# Altium footprint library Connectors THD.PcbLib: 631 footprints (part 46 of 46)
Each footprint in its own frame and in the unit in brackets; x right, y up, seen from the top. Pads: shape width x height; smd on the part's side, far side on the other; paste and mask are expansions set on the pad; w line width, h text height; cw(c..) or ccw(c..) is an arc to the next point about the centre after c.
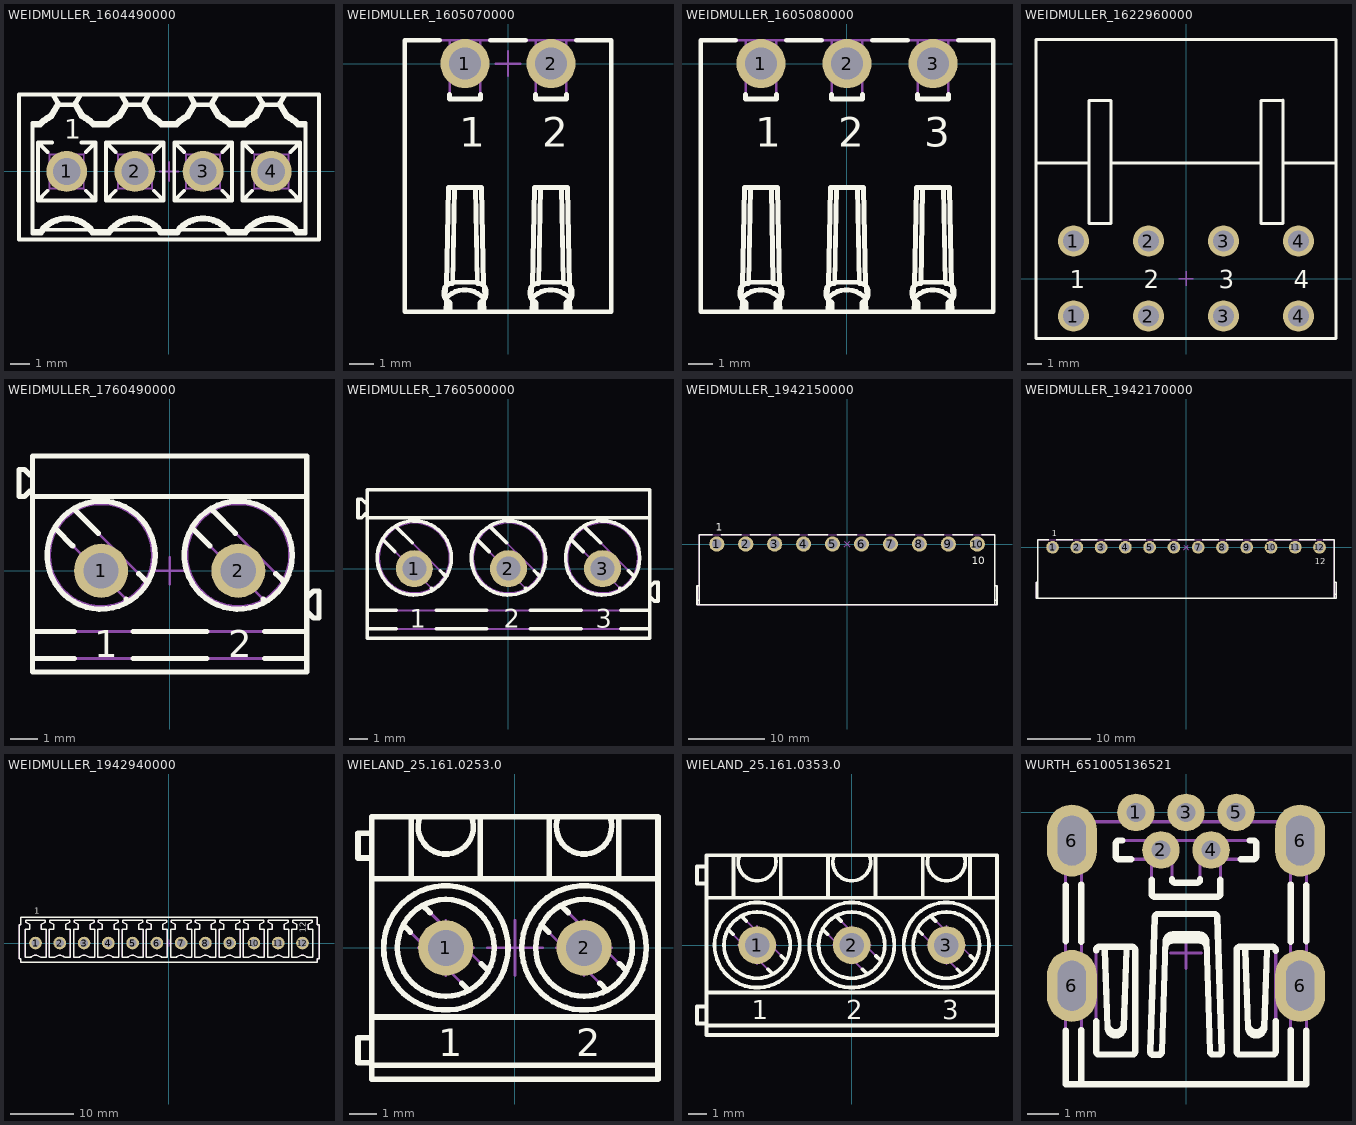
[diagram p45: the footprints below, top view; thin cyan lines are the x and y axes]

## WEIDMULLER_1604490000 [mm] "17A 320 V, Pitch 3.5mm, 4 Positions PCB Male Header, Type SL 3.5 Serie"
height 11.1
pads (4):
  round 2.1 hole 1.4: 1(-5.25,0) 2(-1.75,0) 3(1.75,0) 4(5.25,0)
Top Overlay:
  drawing of 183 lines, arcs and shapes, not listed
  text "1" at -5.388,1.675 h1
Mechanical 8:
  lines w0.1: -5.75,0 -5.25,0 ; -5.25,-0.5 -5.25,0 ; -5.25,0.5 -5.25,0 ; -4.75,0 -5.25,0 ; -2.25,0 -1.75,0 ; -1.75,-0.5 -1.75,0 ; -1.75,0.5 -1.75,0 ; -1.25,0 -1.75,0 ; -0.5,0 0,0 ; 0,-0.5 0,0 ; 0,0.5 0,0 ; 0.5,0 0,0 ; 1.25,0 1.75,0 ; 1.75,-0.5 1.75,0 ; 1.75,0.5 1.75,0 ; 2.25,0 1.75,0 ; 4.75,0 5.25,0 ; 5.25,-0.5 5.25,0 ; 5.25,0.5 5.25,0 ; 5.75,0 5.25,0
Mechanical 14:
  drawing of 215 lines, arcs and shapes, not listed
  text "1" at -5.388,1.675 h1
3D body: height 11.05, standoff -3.2, extent -7.7,-3.5 7.7,3.95

## WEIDMULLER_1605070000 [mm] "10A 300 V, Pitch 3.5mm, 2 Positions PCB Right Angle Header, BL/SL 3.50 Serie"
height 7.5
pads (2):
  round 2 hole 1.3: 1(-1.75,0) 2(1.75,0)
Top Overlay:
  lines w0.2: -2.778,0.95 -4.2,0.95 -4.2,-10.1 4.2,-10.1 4.2,0.95 2.778,0.95 ; -2.559,-9.551 -2.55,-9.084 ; -2.535,-9.572 cw(c-1.758,-10.206) -0.982,-9.572 ; -2.518,-10.1 -2.508,-9.616 ; -2.496,-9.023 -2.416,-5.05 -1.084,-5.05 -1.004,-9.023 ; -2.375,-1.253 -2.375,-1.45 -1.125,-1.45 -1.125,-1.253 ; -2.36,-10.1 -2.36,-9.783 ccw(c-2.485,-9.783) -2.431,-9.67 cw(c-2.3,-9.4) -2.6,-9.4 -2.6,-9.25 cw(c-2.3,-9.25) -2.3,-8.95 -2.247,-8.95 -2.179,-5.05 ; -2.25,-8.9 -1.254,-8.9 ; -1.321,-5.05 -1.253,-8.95 -1.2,-8.95 cw(c-1.2,-9.25) -0.9,-9.25 -0.9,-9.4 cw(c-1.2,-9.4) -1.069,-9.67 ccw(c-1.015,-9.783) -1.14,-9.783 -1.14,-10.1 ; -0.992,-9.616 -0.983,-10.1 ; -0.95,-9.084 -0.941,-9.551 ; -0.722,0.95 0.722,0.95 ; 0.941,-9.551 0.95,-9.084 ; 0.965,-9.572 cw(c1.742,-10.206) 2.518,-9.572 ; 0.983,-10.1 0.992,-9.616 ; 1.004,-9.023 1.084,-5.05 2.416,-5.05 2.496,-9.023 ; 1.125,-1.253 1.125,-1.45 2.375,-1.45 2.375,-1.253 ; 1.14,-10.1 1.14,-9.783 ccw(c1.015,-9.783) 1.069,-9.67 cw(c1.2,-9.4) 0.9,-9.4 0.9,-9.25 cw(c1.2,-9.25) 1.2,-8.95 1.253,-8.95 1.321,-5.05 ; 1.25,-8.9 2.246,-8.9 ; 2.179,-5.05 2.247,-8.95 2.3,-8.95 cw(c2.3,-9.25) 2.6,-9.25 2.6,-9.4 cw(c2.3,-9.4) 2.431,-9.67 ccw(c2.485,-9.783) 2.36,-9.783 2.36,-10.1 ; 2.508,-9.616 2.518,-10.1 ; 2.55,-9.084 2.559,-9.551
  text "2" at 1.385,-3.375 h1.2
  text "1" at -1.99,-3.375 h1.2
Mechanical 8:
  lines w0.1: -2.25,0 -1.75,0 ; -1.75,-0.5 -1.75,0 ; -1.75,0.5 -1.75,0 ; -1.25,0 -1.75,0 ; -0.5,0 0,0 ; 0,-0.5 0,0 ; 0,0.5 0,0 ; 0.5,0 0,0 ; 1.25,0 1.75,0 ; 1.75,-0.5 1.75,0 ; 1.75,0.5 1.75,0 ; 2.25,0 1.75,0
Mechanical 14:
  lines w0.1: -2.559,-9.551 -2.55,-9.084 ; -2.535,-9.572 cw(c-1.758,-10.206) -0.982,-9.572 ; -2.518,-10.1 -2.508,-9.616 ; -2.496,-9.023 -2.416,-5.05 -1.084,-5.05 -1.004,-9.023 ; -2.375,0.95 -2.375,-1.45 -1.125,-1.45 -1.125,0.95 ; -2.36,-10.1 -2.36,-9.783 ccw(c-2.485,-9.783) -2.431,-9.67 cw(c-2.3,-9.4) -2.6,-9.4 -2.6,-9.25 cw(c-2.3,-9.25) -2.3,-8.95 -2.247,-8.95 -2.179,-5.05 ; -2.25,-8.9 -1.254,-8.9 ; -1.321,-5.05 -1.253,-8.95 -1.2,-8.95 cw(c-1.2,-9.25) -0.9,-9.25 -0.9,-9.4 cw(c-1.2,-9.4) -1.069,-9.67 ccw(c-1.015,-9.783) -1.14,-9.783 -1.14,-10.1 ; -0.992,-9.616 -0.983,-10.1 ; -0.95,-9.084 -0.941,-9.551 ; 0.941,-9.551 0.95,-9.084 ; 0.965,-9.572 cw(c1.742,-10.206) 2.518,-9.572 ; 0.983,-10.1 0.992,-9.616 ; 1.004,-9.023 1.084,-5.05 2.416,-5.05 2.496,-9.023 ; 1.125,0.95 1.125,-1.45 2.375,-1.45 2.375,0.95 ; 1.14,-10.1 1.14,-9.783 ccw(c1.015,-9.783) 1.069,-9.67 cw(c1.2,-9.4) 0.9,-9.4 0.9,-9.25 cw(c1.2,-9.25) 1.2,-8.95 1.253,-8.95 1.321,-5.05 ; 1.25,-8.9 2.246,-8.9 ; 2.179,-5.05 2.247,-8.95 2.3,-8.95 cw(c2.3,-9.25) 2.6,-9.25 2.6,-9.4 cw(c2.3,-9.4) 2.431,-9.67 ccw(c2.485,-9.783) 2.36,-9.783 2.36,-10.1 ; 2.508,-9.616 2.518,-10.1 ; 2.55,-9.084 2.559,-9.551 ; -4.2,-10.1 4.2,-10.1 4.2,0.95 -4.2,0.95 -4.2,-10.1
  text "1" at -1.99,-3.375 h1.2
  text "2" at 1.385,-3.375 h1.2
3D body: height 7.45, standoff -3.2, extent -4.2,-10.1 4.2,0.95

## WEIDMULLER_1605080000 [mm] "10A 300 V, Pitch 3.5mm, 3 Positions PCB Right Angle Header, BL/SL 3.50 Serie"
height 7.5
pads (3):
  round 2 hole 1.3: 1(-3.5,0) 2(0,0) 3(3.5,0)
Top Overlay:
  lines w0.2: -4.528,0.95 -5.95,0.95 -5.95,-10.1 5.95,-10.1 5.95,0.95 4.528,0.95 ; -4.309,-9.551 -4.3,-9.084 ; -4.285,-9.572 cw(c-3.508,-10.206) -2.732,-9.572 ; -4.267,-10.1 -4.258,-9.616 ; -4.246,-9.023 -4.166,-5.05 -2.834,-5.05 -2.754,-9.023 ; -4.125,-1.253 -4.125,-1.45 -2.875,-1.45 -2.875,-1.253 ; -4.11,-10.1 -4.11,-9.783 ccw(c-4.235,-9.783) -4.181,-9.67 cw(c-4.05,-9.4) -4.35,-9.4 -4.35,-9.25 cw(c-4.05,-9.25) -4.05,-8.95 -3.997,-8.95 -3.929,-5.05 ; -4,-8.9 -3.004,-8.9 ; -3.071,-5.05 -3.003,-8.95 -2.95,-8.95 cw(c-2.95,-9.25) -2.65,-9.25 -2.65,-9.4 cw(c-2.95,-9.4) -2.819,-9.67 ccw(c-2.765,-9.783) -2.89,-9.783 -2.89,-10.1 ; -2.742,-9.616 -2.732,-10.1 ; -2.7,-9.084 -2.691,-9.551 ; -2.472,0.95 -1.028,0.95 ; -0.809,-9.551 -0.8,-9.084 ; -0.785,-9.572 cw(c-0.008,-10.206) 0.768,-9.572 ; -0.767,-10.1 -0.758,-9.616 ; -0.746,-9.023 -0.666,-5.05 0.666,-5.05 0.746,-9.023 ; -0.625,-1.253 -0.625,-1.45 0.625,-1.45 0.625,-1.253 ; -0.61,-10.1 -0.61,-9.783 ccw(c-0.735,-9.783) -0.681,-9.67 cw(c-0.55,-9.4) -0.85,-9.4 -0.85,-9.25 cw(c-0.55,-9.25) -0.55,-8.95 -0.497,-8.95 -0.429,-5.05 ; -0.5,-8.9 0.496,-8.9 ; 0.429,-5.05 0.497,-8.95 0.55,-8.95 cw(c0.55,-9.25) 0.85,-9.25 0.85,-9.4 cw(c0.55,-9.4) 0.681,-9.67 ccw(c0.735,-9.783) 0.61,-9.783 0.61,-10.1 ; 0.758,-9.616 0.768,-10.1 ; 0.8,-9.084 0.809,-9.551 ; 1.028,0.95 2.472,0.95 ; 2.691,-9.551 2.7,-9.084 ; 2.715,-9.572 cw(c3.492,-10.206) 4.268,-9.572 ; 2.733,-10.1 2.742,-9.616 ; 2.754,-9.023 2.834,-5.05 4.166,-5.05 4.246,-9.023 ; 2.875,-1.253 2.875,-1.45 4.125,-1.45 4.125,-1.253 ; 2.89,-10.1 2.89,-9.783 ccw(c2.765,-9.783) 2.819,-9.67 cw(c2.95,-9.4) 2.65,-9.4 2.65,-9.25 cw(c2.95,-9.25) 2.95,-8.95 3.003,-8.95 3.071,-5.05 ; 3,-8.9 3.996,-8.9 ; 3.929,-5.05 3.997,-8.95 4.05,-8.95 cw(c4.05,-9.25) 4.35,-9.25 4.35,-9.4 cw(c4.05,-9.4) 4.181,-9.67 ccw(c4.235,-9.783) 4.11,-9.783 4.11,-10.1 ; 4.258,-9.616 4.268,-10.1 ; 4.3,-9.084 4.309,-9.551
  text "3" at 3.135,-3.375 h1.2
  text "1" at -3.74,-3.375 h1.2
  text "2" at -0.365,-3.375 h1.2
Mechanical 8:
  lines w0.1: -4,0 -3.5,0 ; -3.5,-0.5 -3.5,0 ; -3.5,0.5 -3.5,0 ; -3,0 -3.5,0 ; -0.5,0 0,0 ; 0,-0.5 0,0 ; 0,0.5 0,0 ; 0.5,0 0,0 ; 3,0 3.5,0 ; 3.5,-0.5 3.5,0 ; 3.5,0.5 3.5,0 ; 4,0 3.5,0
Mechanical 14:
  lines w0.1: -4.309,-9.551 -4.3,-9.084 ; -4.285,-9.572 cw(c-3.508,-10.206) -2.732,-9.572 ; -4.267,-10.1 -4.258,-9.616 ; -4.246,-9.023 -4.166,-5.05 -2.834,-5.05 -2.754,-9.023 ; -4.125,0.95 -4.125,-1.45 -2.875,-1.45 -2.875,0.95 ; -4.11,-10.1 -4.11,-9.783 ccw(c-4.235,-9.783) -4.181,-9.67 cw(c-4.05,-9.4) -4.35,-9.4 -4.35,-9.25 cw(c-4.05,-9.25) -4.05,-8.95 -3.997,-8.95 -3.929,-5.05 ; -4,-8.9 -3.004,-8.9 ; -3.071,-5.05 -3.003,-8.95 -2.95,-8.95 cw(c-2.95,-9.25) -2.65,-9.25 -2.65,-9.4 cw(c-2.95,-9.4) -2.819,-9.67 ccw(c-2.765,-9.783) -2.89,-9.783 -2.89,-10.1 ; -2.742,-9.616 -2.732,-10.1 ; -2.7,-9.084 -2.691,-9.551 ; -0.809,-9.551 -0.8,-9.084 ; -0.785,-9.572 cw(c-0.008,-10.206) 0.768,-9.572 ; -0.767,-10.1 -0.758,-9.616 ; -0.746,-9.023 -0.666,-5.05 0.666,-5.05 0.746,-9.023 ; -0.625,0.95 -0.625,-1.45 0.625,-1.45 0.625,0.95 ; -0.61,-10.1 -0.61,-9.783 ccw(c-0.735,-9.783) -0.681,-9.67 cw(c-0.55,-9.4) -0.85,-9.4 -0.85,-9.25 cw(c-0.55,-9.25) -0.55,-8.95 -0.497,-8.95 -0.429,-5.05 ; -0.5,-8.9 0.496,-8.9 ; 0.429,-5.05 0.497,-8.95 0.55,-8.95 cw(c0.55,-9.25) 0.85,-9.25 0.85,-9.4 cw(c0.55,-9.4) 0.681,-9.67 ccw(c0.735,-9.783) 0.61,-9.783 0.61,-10.1 ; 0.758,-9.616 0.768,-10.1 ; 0.8,-9.084 0.809,-9.551 ; 2.691,-9.551 2.7,-9.084 ; 2.715,-9.572 cw(c3.492,-10.206) 4.268,-9.572 ; 2.733,-10.1 2.742,-9.616 ; 2.754,-9.023 2.834,-5.05 4.166,-5.05 4.246,-9.023 ; 2.875,0.95 2.875,-1.45 4.125,-1.45 4.125,0.95 ; 2.89,-10.1 2.89,-9.783 ccw(c2.765,-9.783) 2.819,-9.67 cw(c2.95,-9.4) 2.65,-9.4 2.65,-9.25 cw(c2.95,-9.25) 2.95,-8.95 3.003,-8.95 3.071,-5.05 ; 3,-8.9 3.996,-8.9 ; 3.929,-5.05 3.997,-8.95 4.05,-8.95 cw(c4.05,-9.25) 4.35,-9.25 4.35,-9.4 cw(c4.05,-9.4) 4.181,-9.67 ccw(c4.235,-9.783) 4.11,-9.783 4.11,-10.1 ; 4.258,-9.616 4.268,-10.1 ; 4.3,-9.084 4.309,-9.551 ; -5.95,-10.1 5.95,-10.1 5.95,0.95 -5.95,0.95 -5.95,-10.1
  text "3" at 3.135,-3.375 h1.2
  text "2" at -0.365,-3.375 h1.2
  text "1" at -3.74,-3.375 h1.2
3D body: height 7.45, standoff -3.2, extent -5.95,-10.1 5.95,0.95

## WEIDMULLER_1622960000 [mm] "23A 400 V, Pitch 5.08mm, 4 Positions PCB Female Header, BL/SL 5.08 series"
height 10.3
pads (8):
  round 2.1 hole 1.4: 1(-7.62,-2.54) 1(-7.62,2.54) 2(-2.54,-2.54) 2(-2.54,2.54) 3(2.54,-2.54) 3(2.54,2.54) 4(7.62,-2.54) 4(7.62,2.54)
Top Overlay:
  lines w0.2: -10.16,7.84 -6.58,7.84 ; -5.08,7.84 5.08,7.84 ; 6.58,7.84 10.16,7.84 ; 6.58,12.073 5.08,12.073 5.08,3.74 6.58,3.74 6.58,12.08 ; -10.16,-4.06 10.16,-4.06 10.16,16.19 -10.16,16.19 -10.16,-4.06 ; -6.58,3.74 -5.08,3.74 -5.08,12.073 -6.58,12.073 -6.58,3.74
  text "1" at -7.872,-0.66 h1.2
  text "2" at -2.867,-0.66 h1.2
  text "3" at 2.213,-0.66 h1.2
  text "4" at 7.293,-0.66 h1.2
Mechanical 8:
  lines w0.1: -8.12,-2.54 -7.62,-2.54 ; -8.12,2.54 -7.62,2.54 ; -7.62,-3.04 -7.62,-2.54 ; -7.62,-2.04 -7.62,-2.54 ; -7.62,2.04 -7.62,2.54 ; -7.62,3.04 -7.62,2.54 ; -7.12,-2.54 -7.62,-2.54 ; -7.12,2.54 -7.62,2.54 ; -3.04,-2.54 -2.54,-2.54 ; -3.04,2.54 -2.54,2.54 ; -2.54,-3.04 -2.54,-2.54 ; -2.54,-2.04 -2.54,-2.54 ; -2.54,2.04 -2.54,2.54 ; -2.54,3.04 -2.54,2.54 ; -2.04,-2.54 -2.54,-2.54 ; -2.04,2.54 -2.54,2.54 ; -0.5,0 0,0 ; 0,-0.5 0,0 ; 0,0.5 0,0 ; 0.5,0 0,0 ; 2.04,-2.54 2.54,-2.54 ; 2.04,2.54 2.54,2.54 ; 2.54,-3.04 2.54,-2.54 ; 2.54,-2.04 2.54,-2.54 ; 2.54,2.04 2.54,2.54 ; 2.54,3.04 2.54,2.54 ; 3.04,-2.54 2.54,-2.54 ; 3.04,2.54 2.54,2.54 ; 7.12,-2.54 7.62,-2.54 ; 7.12,2.54 7.62,2.54 ; 7.62,-3.04 7.62,-2.54 ; 7.62,-2.04 7.62,-2.54 ; 7.62,2.04 7.62,2.54 ; 7.62,3.04 7.62,2.54 ; 8.12,-2.54 7.62,-2.54 ; 8.12,2.54 7.62,2.54
Mechanical 14:
  lines w0.1: -10.16,7.84 -6.58,7.84 ; -5.08,7.84 5.08,7.84 ; 6.58,7.84 10.16,7.84 ; 6.58,12.073 5.08,12.073 5.08,3.74 6.58,3.74 6.58,12.08 ; -10.16,-4.06 -10.16,16.19 10.16,16.19 10.16,-4.06 -10.16,-4.06 ; -6.58,3.74 -6.58,12.073 -5.08,12.073 -5.08,3.74 -6.58,3.74
  text "1" at -7.872,-0.66 h1.2
  text "2" at -2.867,-0.66 h1.2
  text "3" at 2.213,-0.66 h1.2
  text "4" at 7.293,-0.66 h1.2
3D body: height 10.28, standoff -3.2, extent -10.16,-4.06 10.16,16.19

## WEIDMULLER_1760490000 [mm] "Terminal Block, 24A 600V, Pitch 5.08mm, 2 Positions, Screw Connection"
height 10
pads (2):
  round 2 hole 1.3: 1(-2.54,0) 2(2.54,0)
Top Overlay:
  circle w0.2: c2.54,0.577 r2
  circle w0.2: c-2.54,0.577 r2
  lines w0.2: -5.08,-3.25 -3.525,-3.25 ; -5.08,-2.25 -3.525,-2.25 ; -5.08,2.75 5.08,2.75 ; -5.08,2.95 -5.18,2.95 -5.38,2.75 -5.58,2.75 -5.58,3.75 -5.38,3.75 -5.18,3.55 -5.08,3.55 ; -4.19,1.52 -3.593,0.923 ; -3.483,2.227 -2.651,1.396 ; -1.617,-1.053 -1.597,-1.073 ; -1.35,-3.25 1.375,-3.25 ; -1.35,-2.25 1.375,-2.25 ; -1.144,-0.111 -0.89,-0.366 ; 0.89,1.52 1.487,0.923 ; 1.597,2.227 2.429,1.396 ; 3.463,-1.053 3.483,-1.073 ; 3.525,-3.25 5.08,-3.25 ; 3.525,-2.25 5.08,-2.25 ; 3.936,-0.111 4.19,-0.366 ; 5.08,-1.55 5.13,-1.55 5.33,-1.75 5.53,-1.75 5.53,-0.75 5.33,-0.75 5.13,-0.95 5.08,-0.95 ; -5.08,-3.75 5.08,-3.75 5.08,4.25 -5.08,4.25 -5.08,-3.75
  text "2" at 2.169,-3.2 h1
  text "1" at -2.792,-3.2 h1
Mechanical 8:
  lines w0.1: -3.04,0 -2.54,0 ; -2.54,-0.5 -2.54,0 ; -2.54,0.5 -2.54,0 ; -2.04,0 -2.54,0 ; -0.5,0 0,0 ; 0,-0.5 0,0 ; 0,0.5 0,0 ; 0.5,0 0,0 ; 2.04,0 2.54,0 ; 2.54,-0.5 2.54,0 ; 2.54,0.5 2.54,0 ; 3.04,0 2.54,0
Mechanical 14:
  circle w0.1: c2.54,0.577 r2
  circle w0.1: c2.54,0.577 r1.9
  circle w0.1: c-2.54,0.577 r2
  circle w0.1: c-2.54,0.577 r1.9
  lines w0.1: -5.08,-3.25 5.08,-3.25 ; -5.08,-2.25 5.08,-2.25 ; -5.08,2.75 5.08,2.75 ; -5.08,2.95 -5.18,2.95 -5.38,2.75 -5.58,2.75 -5.58,3.75 -5.38,3.75 -5.18,3.55 -5.08,3.55 ; -4.19,1.52 -1.597,-1.073 ; -3.483,2.227 -0.89,-0.366 ; 0.89,1.52 3.483,-1.073 ; 1.597,2.227 4.19,-0.366 ; 5.08,-1.55 5.13,-1.55 5.33,-1.75 5.53,-1.75 5.53,-0.75 5.33,-0.75 5.13,-0.95 5.08,-0.95 ; -5.08,-3.75 5.08,-3.75 5.08,4.25 -5.08,4.25 -5.08,-3.75
  text "1" at -2.792,-3.2 h1
  text "2" at 2.169,-3.2 h1
3D body: height 10, standoff -3.5, extent -5.58,-3.75 5.53,4.25

## WEIDMULLER_1760500000 [mm] "Terminal Block, 24A 600V, Pitch 5.08mm, 3 Positions, Screw Connection"
height 10
pads (3):
  round 2 hole 1.3: 1(-5.08,0) 2(0,0) 3(5.08,0)
Top Overlay:
  circle w0.2: c-5.08,0.577 r2
  circle w0.2: c0,0.577 r2
  circle w0.2: c5.08,0.577 r2
  lines w0.2: -7.62,-3.25 -6.065,-3.25 ; -7.62,-2.25 -6.065,-2.25 ; -7.62,2.75 7.62,2.75 ; -7.62,2.95 -7.72,2.95 -7.92,2.75 -8.12,2.75 -8.12,3.75 -7.92,3.75 -7.72,3.55 -7.62,3.55 ; -6.73,1.52 -6.133,0.923 ; -6.023,2.227 -5.191,1.396 ; -4.157,-1.053 -4.137,-1.073 ; -3.89,-3.25 -1.165,-3.25 ; -3.89,-2.25 -1.165,-2.25 ; -3.684,-0.111 -3.43,-0.366 ; -1.65,1.52 -1.053,0.923 ; -0.943,2.227 -0.111,1.396 ; 0.923,-1.053 0.943,-1.073 ; 1.19,-3.25 3.915,-3.25 ; 1.19,-2.25 3.915,-2.25 ; 1.396,-0.111 1.65,-0.366 ; 3.43,1.52 4.027,0.923 ; 4.137,2.227 4.969,1.396 ; 6.003,-1.053 6.023,-1.073 ; 6.065,-3.25 7.62,-3.25 ; 6.065,-2.25 7.62,-2.25 ; 6.476,-0.111 6.73,-0.366 ; 7.62,-1.55 7.67,-1.55 7.87,-1.75 8.07,-1.75 8.07,-0.75 7.87,-0.75 7.67,-0.95 7.62,-0.95 ; -7.62,-3.75 7.62,-3.75 7.62,4.25 -7.62,4.25 -7.62,-3.75
  text "2" at -0.252,-3.2 h1
  text "1" at -5.332,-3.2 h1
  text "3" at 4.709,-3.2 h1
Mechanical 8:
  lines w0.1: -5.58,0 -5.08,0 ; -5.08,-0.5 -5.08,0 ; -5.08,0.5 -5.08,0 ; -4.58,0 -5.08,0 ; -0.5,0 0,0 ; 0,-0.5 0,0 ; 0,0.5 0,0 ; 0.5,0 0,0 ; 4.58,0 5.08,0 ; 5.08,-0.5 5.08,0 ; 5.08,0.5 5.08,0 ; 5.58,0 5.08,0
Mechanical 14:
  circle w0.1: c-5.08,0.577 r2
  circle w0.1: c-5.08,0.577 r1.9
  circle w0.1: c0,0.577 r2
  circle w0.1: c0,0.577 r1.9
  circle w0.1: c5.08,0.577 r2
  circle w0.1: c5.08,0.577 r1.9
  lines w0.1: -7.62,-3.25 7.62,-3.25 ; -7.62,-2.25 7.62,-2.25 ; -7.62,2.75 7.62,2.75 ; -7.62,2.95 -7.72,2.95 -7.92,2.75 -8.12,2.75 -8.12,3.75 -7.92,3.75 -7.72,3.55 -7.62,3.55 ; -6.73,1.52 -4.137,-1.073 ; -6.023,2.227 -3.43,-0.366 ; -1.65,1.52 0.943,-1.073 ; -0.943,2.227 1.65,-0.366 ; 3.43,1.52 6.023,-1.073 ; 4.137,2.227 6.73,-0.366 ; 7.62,-1.55 7.67,-1.55 7.87,-1.75 8.07,-1.75 8.07,-0.75 7.87,-0.75 7.67,-0.95 7.62,-0.95 ; -7.62,-3.75 7.62,-3.75 7.62,4.25 -7.62,4.25 -7.62,-3.75
  text "2" at -0.252,-3.2 h1
  text "1" at -5.332,-3.2 h1
  text "3" at 4.709,-3.2 h1
3D body: height 10, standoff -3.5, extent -8.12,-3.75 8.07,4.25

## WEIDMULLER_1942150000 [mm] "10A 300 V, Pitch 3.81mm, 10 Positions PCB Right Angle Male Header, BC/SC 3.81 Serie"
height 7.1
pads (10):
  round 2 hole 1.3: 1(-17.145,0) 2(-13.335,0) 3(-9.525,0) 4(-5.715,0) 5(-1.905,0) 6(1.905,0) 7(5.715,0) 8(9.525,0) 9(13.335,0) 10(17.145,0)
Top Overlay:
  lines w0.2: -19.75,-7.395 -19.45,-7.395 ; -19.45,-7.995 -19.45,1.205 -17.754,1.205 ; -19.45,-5.495 -19.75,-5.495 -19.75,-7.995 19.74,-7.995 19.74,-5.495 19.44,-5.495 ; -16.536,1.205 -13.944,1.205 ; -12.726,1.205 -10.134,1.205 ; -8.916,1.205 -6.324,1.205 ; -5.106,1.205 -2.514,1.205 ; -1.296,1.205 1.296,1.205 ; 2.514,1.205 5.106,1.205 ; 6.324,1.205 8.916,1.205 ; 10.134,1.205 12.726,1.205 ; 13.944,1.205 16.536,1.205 ; 17.754,1.205 19.44,1.205 19.44,-7.995 ; 19.44,-7.395 19.74,-7.395
  text "10" at 16.405,-2.65 h1
  text "1" at -17.28,1.75 h1
Mechanical 8:
  lines w0.1: -17.645,0 -17.145,0 ; -17.145,-0.5 -17.145,0 ; -17.145,0.5 -17.145,0 ; -16.645,0 -17.145,0 ; -13.835,0 -13.335,0 ; -13.335,-0.5 -13.335,0 ; -13.335,0.5 -13.335,0 ; -12.835,0 -13.335,0 ; -10.025,0 -9.525,0 ; -9.525,-0.5 -9.525,0 ; -9.525,0.5 -9.525,0 ; -9.025,0 -9.525,0 ; -6.215,0 -5.715,0 ; -5.715,-0.5 -5.715,0 ; -5.715,0.5 -5.715,0 ; -5.215,0 -5.715,0 ; -2.405,0 -1.905,0 ; -1.905,-0.5 -1.905,0 ; -1.905,0.5 -1.905,0 ; -1.405,0 -1.905,0 ; -0.354,-0.354 0,0 ; -0.354,0.354 0,0 ; 0.354,-0.354 0,0 ; 0.354,0.354 0,0 ; 1.405,0 1.905,0 ; 1.905,-0.5 1.905,0 ; 1.905,0.5 1.905,0 ; 2.405,0 1.905,0 ; 5.215,0 5.715,0 ; 5.715,-0.5 5.715,0 ; 5.715,0.5 5.715,0 ; 6.215,0 5.715,0 ; 9.025,0 9.525,0 ; 9.525,-0.5 9.525,0 ; 9.525,0.5 9.525,0 ; 10.025,0 9.525,0 ; 12.835,0 13.335,0 ; 13.335,-0.5 13.335,0 ; 13.335,0.5 13.335,0 ; 13.835,0 13.335,0 ; 16.645,0 17.145,0 ; 17.145,-0.5 17.145,0 ; 17.145,0.5 17.145,0 ; 17.645,0 17.145,0
Mechanical 14:
  lines w0.1: -19.75,-7.395 -19.45,-7.395 ; -19.45,-7.995 -19.45,1.205 19.44,1.205 19.44,-7.995 ; -19.45,-5.495 -19.75,-5.495 -19.75,-7.995 19.74,-7.995 19.74,-5.495 19.44,-5.495 ; 19.44,-7.395 19.74,-7.395
  text "10" at 16.405,-2.65 h1
  text "9" at 12.995,-2.65 h1
  text "8" at 9.185,-2.65 h1
  text "7" at 5.375,-2.65 h1
  text "6" at 1.565,-2.65 h1
  text "5" at -2.245,-2.65 h1
  text "4" at -6.055,-2.65 h1
  text "3" at -9.865,-2.65 h1
  text "2" at -13.675,-2.65 h1
  text "1" at -17.485,-2.65 h1
3D body: height 7.05, standoff -3.2, extent -19.75,-7.995 19.74,1.205

## WEIDMULLER_1942170000 [mm] "10A 300 V, Pitch 3.81mm, 12 Positions PCB Right Angle Male Header, BC/SC 3.81 Serie"
height 7.1
pads (12):
  round 2 hole 1.3: 1(-20.955,0) 2(-17.145,0) 3(-13.335,0) 4(-9.525,0) 5(-5.715,0) 6(-1.905,0) 7(1.905,0) 8(5.715,0) 9(9.525,0) 10(13.335,0) 11(17.145,0) 12(20.955,0)
Top Overlay:
  lines w0.2: -23.56,-7.395 -23.26,-7.395 ; -23.26,-7.995 -23.26,1.205 -21.564,1.205 ; -23.26,-5.495 -23.56,-5.495 -23.56,-7.995 23.55,-7.995 23.55,-5.495 23.25,-5.495 ; -20.346,1.205 -17.754,1.205 ; -16.536,1.205 -13.944,1.205 ; -12.726,1.205 -10.134,1.205 ; -8.916,1.205 -6.324,1.205 ; -5.106,1.205 -2.514,1.205 ; -1.296,1.205 1.296,1.205 ; 2.514,1.205 5.106,1.205 ; 6.324,1.205 8.916,1.205 ; 10.134,1.205 12.726,1.205 ; 13.944,1.205 16.536,1.205 ; 17.754,1.205 20.346,1.205 ; 21.564,1.205 23.25,1.205 23.25,-7.995 ; 23.25,-7.395 23.55,-7.395
  text "12" at 20.215,-2.65 h1
  text "1" at -21.09,1.75 h1
Mechanical 8:
  lines w0.1: -21.455,0 -20.955,0 ; -20.955,-0.5 -20.955,0 ; -20.955,0.5 -20.955,0 ; -20.455,0 -20.955,0 ; -17.645,0 -17.145,0 ; -17.145,-0.5 -17.145,0 ; -17.145,0.5 -17.145,0 ; -16.645,0 -17.145,0 ; -13.835,0 -13.335,0 ; -13.335,-0.5 -13.335,0 ; -13.335,0.5 -13.335,0 ; -12.835,0 -13.335,0 ; -10.025,0 -9.525,0 ; -9.525,-0.5 -9.525,0 ; -9.525,0.5 -9.525,0 ; -9.025,0 -9.525,0 ; -6.215,0 -5.715,0 ; -5.715,-0.5 -5.715,0 ; -5.715,0.5 -5.715,0 ; -5.215,0 -5.715,0 ; -2.405,0 -1.905,0 ; -1.905,-0.5 -1.905,0 ; -1.905,0.5 -1.905,0 ; -1.405,0 -1.905,0 ; -0.354,-0.354 0,0 ; -0.354,0.354 0,0 ; 0.354,-0.354 0,0 ; 0.354,0.354 0,0 ; 1.405,0 1.905,0 ; 1.905,-0.5 1.905,0 ; 1.905,0.5 1.905,0 ; 2.405,0 1.905,0 ; 5.215,0 5.715,0 ; 5.715,-0.5 5.715,0 ; 5.715,0.5 5.715,0 ; 6.215,0 5.715,0 ; 9.025,0 9.525,0 ; 9.525,-0.5 9.525,0 ; 9.525,0.5 9.525,0 ; 10.025,0 9.525,0 ; 12.835,0 13.335,0 ; 13.335,-0.5 13.335,0 ; 13.335,0.5 13.335,0 ; 13.835,0 13.335,0 ; 16.645,0 17.145,0 ; 17.145,-0.5 17.145,0 ; 17.145,0.5 17.145,0 ; 17.645,0 17.145,0 ; 20.455,0 20.955,0 ; 20.955,-0.5 20.955,0 ; 20.955,0.5 20.955,0 ; 21.455,0 20.955,0
Mechanical 14:
  lines w0.1: -23.56,-7.395 -23.26,-7.395 ; -23.26,-7.995 -23.26,1.205 23.25,1.205 23.25,-7.995 ; -23.26,-5.495 -23.56,-5.495 -23.56,-7.995 23.55,-7.995 23.55,-5.495 23.25,-5.495 ; 23.25,-7.395 23.55,-7.395
  text "12" at 20.215,-2.65 h1
  text "11" at 16.405,-2.65 h1
  text "1" at -21.295,-2.65 h1
  text "2" at -17.485,-2.65 h1
  text "3" at -13.675,-2.65 h1
  text "4" at -9.865,-2.65 h1
  text "5" at -6.055,-2.65 h1
  text "6" at -2.245,-2.65 h1
  text "7" at 1.565,-2.65 h1
  text "8" at 5.375,-2.65 h1
  text "9" at 9.185,-2.65 h1
  text "10" at 12.595,-2.65 h1
3D body: height 7.05, standoff -3.2, extent -23.56,-7.995 23.55,1.205

## WEIDMULLER_1942940000 [mm] "24A 400 V, Pitch 3.81mm, 12 Positions PCB Male Header, Type SC 3.81 Serie"
height 9.2
pads (12):
  round 2 hole 1.3: 1(-20.955,0) 2(-17.145,0) 3(-13.335,0) 4(-9.525,0) 5(-5.715,0) 6(-1.905,0) 7(1.905,0) 8(5.715,0) 9(9.525,0) 10(13.335,0) 11(17.145,0) 12(20.955,0)
Top Overlay:
  drawing of 194 lines, arcs and shapes, not listed
  text "1" at -21.19,4.6 h1
  text "12" at 21.475,1.615 h1
Mechanical 8:
  lines w0.1: -21.455,0 -20.955,0 ; -20.955,-0.5 -20.955,0 ; -20.955,0.5 -20.955,0 ; -20.455,0 -20.955,0 ; -17.645,0 -17.145,0 ; -17.145,-0.5 -17.145,0 ; -17.145,0.5 -17.145,0 ; -16.645,0 -17.145,0 ; -13.835,0 -13.335,0 ; -13.335,-0.5 -13.335,0 ; -13.335,0.5 -13.335,0 ; -12.835,0 -13.335,0 ; -10.025,0 -9.525,0 ; -9.525,-0.5 -9.525,0 ; -9.525,0.5 -9.525,0 ; -9.025,0 -9.525,0 ; -6.215,0 -5.715,0 ; -5.715,-0.5 -5.715,0 ; -5.715,0.5 -5.715,0 ; -5.215,0 -5.715,0 ; -2.405,0 -1.905,0 ; -1.905,-0.5 -1.905,0 ; -1.905,0.5 -1.905,0 ; -1.405,0 -1.905,0 ; -0.5,0 0,0 ; 0,-0.5 0,0 ; 0,0.5 0,0 ; 0.5,0 0,0 ; 1.405,0 1.905,0 ; 1.905,-0.5 1.905,0 ; 1.905,0.5 1.905,0 ; 2.405,0 1.905,0 ; 5.215,0 5.715,0 ; 5.715,-0.5 5.715,0 ; 5.715,0.5 5.715,0 ; 6.215,0 5.715,0 ; 9.025,0 9.525,0 ; 9.525,-0.5 9.525,0 ; 9.525,0.5 9.525,0 ; 10.025,0 9.525,0 ; 12.835,0 13.335,0 ; 13.335,-0.5 13.335,0 ; 13.335,0.5 13.335,0 ; 13.835,0 13.335,0 ; 16.645,0 17.145,0 ; 17.145,-0.5 17.145,0 ; 17.145,0.5 17.145,0 ; 17.645,0 17.145,0 ; 20.455,0 20.955,0 ; 20.955,-0.5 20.955,0 ; 20.955,0.5 20.955,0 ; 21.455,0 20.955,0
Mechanical 14:
  drawing of 194 lines, arcs and shapes, not listed
  text "6" at -2.245,1.4 h1
  text "5" at -6.055,1.4 h1
  text "4" at -9.865,1.4 h1
  text "1" at -21.09,1.4 h1
  text "2" at -17.485,1.4 h1
  text "3" at -13.675,1.4 h1
  text "7" at 1.565,1.4 h1
  text "8" at 5.375,1.4 h1
  text "12" at 21.475,1.615 h1
  text "11" at 16.405,1.4 h1
  text "9" at 9.185,1.4 h1
  text "10" at 12.595,1.4 h1
3D body: height 9.2, standoff -3.2, extent -23.555,-3 23.555,4.05

## WIELAND_25.161.0253.0 [mm] "Terminal Block, Pitch 5mm, 2 Positions, Screw Connection"
height 15
pads (2):
  round 2 hole 1.3: 1(-2.5,0) 2(2.5,0)
Top Overlay:
  circle w0.2: c-2.5,0 r1.75
  circle w0.2: c-2.5,0 r2.25
  circle w0.2: c2.5,0 r1.75
  circle w0.2: c2.5,0 r2.25
  lines w0.2: -5.175,-4.25 5.175,-4.25 ; -5.175,-4.15 -5.675,-4.15 -5.675,-3.25 -5.175,-3.25 ; -5.175,-2.5 5.175,-2.5 ; -5.175,2.5 5.175,2.5 ; -5.175,3.25 -5.675,3.25 -5.675,4.15 -5.175,4.15 ; -4.039,0.832 -3.778,0.571 ; -3.75,2.5 -3.75,4.75 ; -3.433,4.75 ccw(c-2.5,4.391) -1.567,4.75 ; -3.332,1.539 -3.071,1.278 ; -1.929,-1.278 -1.668,-1.539 ; -1.25,2.5 -1.25,4.75 ; -1.222,-0.571 -0.961,-0.832 ; 0.961,0.832 1.222,0.571 ; 1.25,2.5 1.25,4.75 ; 1.567,4.75 ccw(c2.5,4.391) 3.433,4.75 ; 1.668,1.539 1.929,1.278 ; 3.071,-1.278 3.332,-1.539 ; 3.75,2.5 3.75,4.75 ; 3.778,-0.571 4.039,-0.832 ; -5.175,-4.75 -5.175,4.75 5.175,4.75 5.175,-4.75 -5.175,-4.75
  text "1" at -2.78,-3.922 h1
  text "2" at 2.219,-3.922 h1
Mechanical 8:
  lines w0.1: -3.5,0 -2.5,0 ; -2.5,-1 -2.5,0 ; -2.5,1 -2.5,0 ; -1.5,0 -2.5,0 ; -1,0 0,0 ; 0,-1 0,0 ; 0,1 0,0 ; 1,0 0,0 ; 1.5,0 2.5,0 ; 2.5,-1 2.5,0 ; 2.5,1 2.5,0 ; 3.5,0 2.5,0
Mechanical 14:
  circle w0.1: c-2.5,0 r2.25
  circle w0.1: c2.5,0 r2.25
  circle w0.1: c-2.5,0 r1.75
  circle w0.1: c2.5,0 r1.75
  lines w0.1: -5.175,-4.25 5.175,-4.25 ; -5.175,-4.15 -5.675,-4.15 -5.675,-3.25 -5.175,-3.25 ; -5.175,-2.5 5.175,-2.5 ; -5.175,2.5 5.175,2.5 ; -5.175,3.25 -5.675,3.25 -5.675,4.15 -5.175,4.15 ; -4.039,0.832 -1.668,-1.539 ; -3.75,2.5 -3.75,4.75 ; -3.433,4.75 ccw(c-2.5,4.391) -1.567,4.75 ; -3.332,1.539 -0.961,-0.832 ; -1.25,2.5 -1.25,4.75 ; 0.961,0.832 3.332,-1.539 ; 1.25,2.5 1.25,4.75 ; 1.567,4.75 ccw(c2.5,4.391) 3.433,4.75 ; 1.668,1.539 4.039,-0.832 ; 3.75,2.5 3.75,4.75 ; -5.175,-4.75 -5.175,4.75 5.175,4.75 5.175,-4.75 -5.175,-4.75
  text "2" at 2.219,-3.922 h1
  text "1" at -2.78,-3.922 h1
3D body: height 15, standoff -3.4, extent -5.675,-4.75 5.175,4.75

## WIELAND_25.161.0353.0 [mm] "Terminal Block, Pitch 5mm, 3 Positions, Screw Connection"
height 15
pads (3):
  round 2 hole 1.3: 1(-5,0) 2(0,0) 3(5,0)
Top Overlay:
  circle w0.2: c5,0 r1.75
  circle w0.2: c0,0 r1.75
  circle w0.2: c-5,0 r1.75
  circle w0.2: c5,0 r2.25
  circle w0.2: c0,0 r2.25
  circle w0.2: c-5,0 r2.25
  lines w0.2: -7.675,-4.25 7.675,-4.25 ; -7.675,-4.15 -8.175,-4.15 -8.175,-3.25 -7.675,-3.25 ; -7.675,-2.5 7.675,-2.5 ; -7.675,2.5 7.675,2.5 ; -7.675,3.25 -8.175,3.25 -8.175,4.15 -7.675,4.15 ; -6.539,0.832 -6.278,0.571 ; -6.25,2.5 -6.25,4.75 ; -5.933,4.75 ccw(c-5,4.391) -4.067,4.75 ; -5.832,1.539 -5.571,1.278 ; -4.429,-1.278 -4.168,-1.539 ; -3.75,2.5 -3.75,4.75 ; -3.722,-0.571 -3.461,-0.832 ; -1.539,0.832 -1.278,0.571 ; -1.25,2.5 -1.25,4.75 ; -0.933,4.75 ccw(c0,4.391) 0.933,4.75 ; -0.832,1.539 -0.571,1.278 ; 0.571,-1.278 0.832,-1.539 ; 1.25,2.5 1.25,4.75 ; 1.278,-0.571 1.539,-0.832 ; 3.461,0.832 3.722,0.571 ; 3.75,2.5 3.75,4.75 ; 4.067,4.75 ccw(c5,4.391) 5.933,4.75 ; 4.168,1.539 4.429,1.278 ; 5.571,-1.278 5.832,-1.539 ; 6.25,2.5 6.25,4.75 ; 6.278,-0.571 6.539,-0.832 ; -7.675,-4.75 7.675,-4.75 7.675,4.75 -7.675,4.75 -7.675,-4.75
  text "1" at -5.28,-3.922 h1
  text "2" at -0.281,-3.922 h1
  text "3" at 4.78,-3.922 h1
Mechanical 8:
  lines w0.1: -6,0 -5,0 ; -5,-1 -5,0 ; -5,1 -5,0 ; -4,0 -5,0 ; -1,0 0,0 ; 0,-1 0,0 ; 0,1 0,0 ; 1,0 0,0 ; 4,0 5,0 ; 5,-1 5,0 ; 5,1 5,0 ; 6,0 5,0
Mechanical 14:
  circle w0.1: c5,0 r1.75
  circle w0.1: c0,0 r1.75
  circle w0.1: c-5,0 r1.75
  circle w0.1: c5,0 r2.25
  circle w0.1: c0,0 r2.25
  circle w0.1: c-5,0 r2.25
  lines w0.1: -7.675,-4.25 7.675,-4.25 ; -7.675,-4.15 -8.175,-4.15 -8.175,-3.25 -7.675,-3.25 ; -7.675,-2.5 7.675,-2.5 ; -7.675,2.5 7.675,2.5 ; -7.675,3.25 -8.175,3.25 -8.175,4.15 -7.675,4.15 ; -6.539,0.832 -4.168,-1.539 ; -6.25,2.5 -6.25,4.75 ; -5.933,4.75 ccw(c-5,4.391) -4.067,4.75 ; -5.832,1.539 -3.461,-0.832 ; -3.75,2.5 -3.75,4.75 ; -1.539,0.832 0.832,-1.539 ; -1.25,2.5 -1.25,4.75 ; -0.933,4.75 ccw(c0,4.391) 0.933,4.75 ; -0.832,1.539 1.539,-0.832 ; 1.25,2.5 1.25,4.75 ; 3.461,0.832 5.832,-1.539 ; 3.75,2.5 3.75,4.75 ; 4.067,4.75 ccw(c5,4.391) 5.933,4.75 ; 4.168,1.539 6.539,-0.832 ; 6.25,2.5 6.25,4.75 ; -7.675,-4.75 7.675,-4.75 7.675,4.75 -7.675,4.75 -7.675,-4.75
  text "1" at -5.28,-3.922 h1
  text "2" at -0.281,-3.922 h1
  text "3" at 4.78,-3.922 h1
3D body: height 15, standoff -3.4, extent -8.175,-4.75 7.675,4.75

## WURTH_651005136521 [mm] "Mini USB Type B Horizontal 5 Contacts"
height 3.9
pads (9):
  round 1.2 hole 0.6: 1(-1.6,0) 2(-0.8,-1.2) 3(0,0) 4(0.8,-1.2) 5(1.6,0)
  oval 1.6x2.3 hole 0.9 slot 1.6 at 90 deg: 6(-3.65,-5.55) 6(-3.65,-0.9) 6(3.65,-5.55) 6(3.65,-0.9)
Top Overlay:
  lines w0.2: -3.85,-6.982 -3.85,-8.7 3.85,-8.7 3.85,-6.982 ; -3.85,-4.118 -3.85,-2.332 ; -3.35,-8.7 -3.35,-6.958 ; -3.35,-4.142 -3.35,-2.308 ; -2.875,-6.681 -2.875,-7.65 ccw(c-2.775,-7.65) -2.775,-7.75 -1.725,-7.75 ccw(c-1.725,-7.65) -1.625,-7.65 -1.625,-4.4 ccw(c-1.725,-4.4) -1.725,-4.3 -2.775,-4.3 ccw(c-2.775,-4.4) -2.875,-4.4 -2.875,-4.419 ; -2.694,-4.3 cw(c-2.694,-4.396) -2.597,-4.396 -2.509,-6.881 ccw(c-2.25,-6.881) -1.991,-6.881 -1.904,-4.396 ; -2.513,-6.771 ccw(c-2.25,-6.769) -1.987,-6.769 ; -2.036,-0.9 -2.15,-0.9 ccw(c-2.15,-1) -2.25,-1 -2.25,-1.4 ccw(c-2.15,-1.4) -2.15,-1.5 -1.754,-1.5 ; -1.904,-4.403 cw(c-1.801,-4.403) -1.801,-4.3 ; -1.1,-2.154 -1.1,-2.6 ccw(c-1,-2.6) -1,-2.7 1,-2.7 ccw(c1,-2.6) 1.1,-2.6 1.1,-2.154 ; -0.661,-4.328 cw(c-0.425,-4.336) -0.425,-4.1 0.425,-4.1 cw(c0.425,-4.336) 0.661,-4.328 ; -0.45,-2.137 -0.45,-2.15 ccw(c-0.35,-2.15) -0.35,-2.25 0.35,-2.25 ccw(c0.35,-2.15) 0.45,-2.15 0.45,-2.137 ; 1.754,-1.5 2.15,-1.5 ccw(c2.15,-1.4) 2.25,-1.4 2.25,-1 ccw(c2.15,-1) 2.15,-0.9 2.036,-0.9 ; 1.802,-4.3 cw(c1.802,-4.396) 1.898,-4.396 1.987,-6.881 ccw(c2.246,-6.881) 2.504,-6.881 2.592,-4.396 ; 1.983,-6.771 ccw(c2.246,-6.769) 2.508,-6.769 ; 2.591,-4.403 cw(c2.695,-4.403) 2.695,-4.3 ; 2.871,-6.676 2.871,-7.65 cw(c2.771,-7.65) 2.771,-7.75 1.721,-7.75 cw(c1.721,-7.65) 1.621,-7.65 1.621,-4.4 cw(c1.721,-4.4) 1.721,-4.3 2.771,-4.3 cw(c2.771,-4.4) 2.871,-4.4 2.871,-4.424 ; 3.35,-8.7 3.35,-6.958 ; 3.35,-4.142 3.35,-2.308 ; 3.85,-4.118 3.85,-2.332 ; -1.147,-7.653 ccw(c-1.047,-7.657) -1.047,-7.757 -0.872,-7.757 ccw(c-0.872,-7.657) -0.772,-7.66 -0.654,-4.129 cw(c-0.418,-4.137) -0.418,-3.901 0.418,-3.901 cw(c0.418,-4.137) 0.654,-4.129 0.772,-7.653 ccw(c0.872,-7.65) 0.872,-7.75 1.047,-7.75 ccw(c1.047,-7.65) 1.147,-7.647 0.999,-3.347 ccw(c0.9,-3.35) 0.9,-3.25 -0.9,-3.25 ccw(c-0.9,-3.35) -0.999,-3.347 -1.147,-7.653
Mechanical 8:
  lines w0.1: -3.9,-5.9 -3.65,-5.9 ; -3.9,-5.55 -3.65,-5.55 ; -3.9,-5.2 -3.65,-5.2 ; -3.9,-1.25 -3.65,-1.25 ; -3.9,-0.9 -3.65,-0.9 ; -3.9,-0.55 -3.65,-0.55 ; -3.65,-6.15 -3.65,-5.9 ; -3.65,-5.8 -3.65,-5.55 ; -3.65,-5.3 -3.65,-5.55 ; -3.65,-4.95 -3.65,-5.2 ; -3.65,-1.5 -3.65,-1.25 ; -3.65,-1.15 -3.65,-0.9 ; -3.65,-0.65 -3.65,-0.9 ; -3.65,-0.3 -3.65,-0.55 ; -3.4,-5.9 -3.65,-5.9 ; -3.4,-5.55 -3.65,-5.55 ; -3.4,-5.2 -3.65,-5.2 ; -3.4,-1.25 -3.65,-1.25 ; -3.4,-0.9 -3.65,-0.9 ; -3.4,-0.55 -3.65,-0.55 ; -2.1,0 -1.6,0 ; -1.6,-0.5 -1.6,0 ; -1.6,0.5 -1.6,0 ; -1.3,-1.2 -0.8,-1.2 ; -1.1,0 -1.6,0 ; -0.8,-1.7 -0.8,-1.2 ; -0.8,-0.7 -0.8,-1.2 ; -0.5,-4.5 0,-4.5 ; -0.5,0 0,0 ; -0.3,-1.2 -0.8,-1.2 ; 0,-5 0,-4.5 ; 0,-4 0,-4.5 ; 0,-0.5 0,0 ; 0,0.5 0,0 ; 0.3,-1.2 0.8,-1.2 ; 0.5,-4.5 0,-4.5 ; 0.5,0 0,0 ; 0.8,-1.7 0.8,-1.2 ; 0.8,-0.7 0.8,-1.2 ; 1.1,0 1.6,0 ; 1.3,-1.2 0.8,-1.2 ; 1.6,-0.5 1.6,0 ; 1.6,0.5 1.6,0 ; 2.1,0 1.6,0 ; 3.4,-5.9 3.65,-5.9 ; 3.4,-5.55 3.65,-5.55 ; 3.4,-5.2 3.65,-5.2 ; 3.4,-1.25 3.65,-1.25 ; 3.4,-0.9 3.65,-0.9 ; 3.4,-0.55 3.65,-0.55 ; 3.65,-6.15 3.65,-5.9 ; 3.65,-5.8 3.65,-5.55 ; 3.65,-5.3 3.65,-5.55 ; 3.65,-4.95 3.65,-5.2 ; 3.65,-1.5 3.65,-1.25 ; 3.65,-1.15 3.65,-0.9 ; 3.65,-0.65 3.65,-0.9 ; 3.65,-0.3 3.65,-0.55 ; 3.9,-5.9 3.65,-5.9 ; 3.9,-5.55 3.65,-5.55 ; 3.9,-5.2 3.65,-5.2 ; 3.9,-1.25 3.65,-1.25 ; 3.9,-0.9 3.65,-0.9 ; 3.9,-0.55 3.65,-0.55 ; -4.1,-5.9 ccw(c-3.65,-5.9) -3.2,-5.9 -3.2,-5.2 ccw(c-3.65,-5.2) -4.1,-5.2 -4.1,-5.9 ; -4.1,-1.25 ccw(c-3.65,-1.25) -3.2,-1.25 -3.2,-0.55 ccw(c-3.65,-0.55) -4.1,-0.55 -4.1,-1.25 ; 3.2,-5.9 ccw(c3.65,-5.9) 4.1,-5.9 4.1,-5.2 ccw(c3.65,-5.2) 3.2,-5.2 3.2,-5.9 ; 3.2,-1.25 ccw(c3.65,-1.25) 4.1,-1.25 4.1,-0.55 ccw(c3.65,-0.55) 3.2,-0.55 3.2,-1.25
Mechanical 14:
  lines w0.1: -3.85,-5.955 cw(c-3.675,-5.595) -4.075,-5.595 -4.075,-5.505 cw(c-3.675,-5.505) -3.85,-5.145 ; -3.85,-1.305 cw(c-3.675,-0.945) -4.075,-0.945 -4.075,-0.855 cw(c-3.675,-0.855) -3.85,-0.495 ; -3.35,-8.7 -3.35,-0.3 ; -2.694,-4.3 cw(c-2.694,-4.396) -2.597,-4.396 -2.509,-6.881 ccw(c-2.25,-6.881) -1.991,-6.881 -1.904,-4.396 ; -2.513,-6.771 ccw(c-2.25,-6.769) -1.987,-6.769 ; -1.904,-4.403 cw(c-1.801,-4.403) -1.801,-4.3 ; -1.8,-0.3 -1.8,0.125 -1.4,0.125 -1.4,-0.3 ; -0.661,-4.328 cw(c-0.425,-4.336) -0.425,-4.1 0.425,-4.1 cw(c0.425,-4.336) 0.661,-4.328 ; -0.55,-0.9 cw(c-0.55,-1) -0.45,-1 -0.45,-2.15 ccw(c-0.35,-2.15) -0.35,-2.25 0.35,-2.25 ccw(c0.35,-2.15) 0.45,-2.15 0.45,-1 cw(c0.55,-1) 0.55,-0.9 ; -0.2,-0.3 -0.2,0.125 0.2,0.125 0.2,-0.3 ; 1.4,-0.3 1.4,0.125 1.8,0.125 1.8,-0.3 ; 1.802,-4.3 cw(c1.802,-4.396) 1.898,-4.396 1.987,-6.881 ccw(c2.246,-6.881) 2.504,-6.881 2.592,-4.396 ; 1.983,-6.771 ccw(c2.246,-6.769) 2.508,-6.769 ; 2.591,-4.403 cw(c2.695,-4.403) 2.695,-4.3 ; 3.35,-8.7 3.35,-0.3 ; 3.85,-5.955 ccw(c3.675,-5.595) 4.075,-5.595 4.075,-5.505 ccw(c3.675,-5.505) 3.85,-5.145 ; 3.85,-1.305 ccw(c3.675,-0.945) 4.075,-0.945 4.075,-0.855 ccw(c3.675,-0.855) 3.85,-0.495 ; -3.85,-8.7 -3.85,-0.3 3.85,-0.3 3.85,-8.7 -3.85,-8.7 ; -2.875,-7.65 ccw(c-2.775,-7.65) -2.775,-7.75 -1.725,-7.75 ccw(c-1.725,-7.65) -1.625,-7.65 -1.625,-4.4 ccw(c-1.725,-4.4) -1.725,-4.3 -2.775,-4.3 ccw(c-2.775,-4.4) -2.875,-4.4 -2.875,-7.65 ; -2.25,-1.4 ccw(c-2.15,-1.4) -2.15,-1.5 -1.2,-1.5 cw(c-1.2,-1.6) -1.1,-1.6 -1.1,-2.6 ccw(c-1,-2.6) -1,-2.7 1,-2.7 ccw(c1,-2.6) 1.1,-2.6 1.1,-1.6 cw(c1.2,-1.6) 1.2,-1.5 2.15,-1.5 ccw(c2.15,-1.4) 2.25,-1.4 2.25,-1 ccw(c2.15,-1) 2.15,-0.9 -2.15,-0.9 ccw(c-2.15,-1) -2.25,-1 -2.25,-1.4 ; -1.147,-7.653 ccw(c-1.047,-7.657) -1.047,-7.757 -0.872,-7.757 ccw(c-0.872,-7.657) -0.772,-7.66 -0.654,-4.129 cw(c-0.418,-4.137) -0.418,-3.901 0.418,-3.901 cw(c0.418,-4.137) 0.654,-4.129 0.772,-7.653 ccw(c0.872,-7.65) 0.872,-7.75 1.047,-7.75 ccw(c1.047,-7.65) 1.147,-7.647 0.999,-3.347 ccw(c0.9,-3.35) 0.9,-3.25 -0.9,-3.25 ccw(c-0.9,-3.35) -0.999,-3.347 -1.147,-7.653 ; 1.621,-7.65 ccw(c1.721,-7.65) 1.721,-7.75 2.771,-7.75 ccw(c2.771,-7.65) 2.871,-7.65 2.871,-4.4 ccw(c2.771,-4.4) 2.771,-4.3 1.721,-4.3 ccw(c1.721,-4.4) 1.621,-4.4 1.621,-7.65
3D body: height 3.9, standoff -2.6, extent -4.075,-8.7 4.075,0.125